# Altium integrated library DigitalLabBoard.IntLib: 47 symbols
Pins are listed as number, name and electrical type; pins without a type are passive.

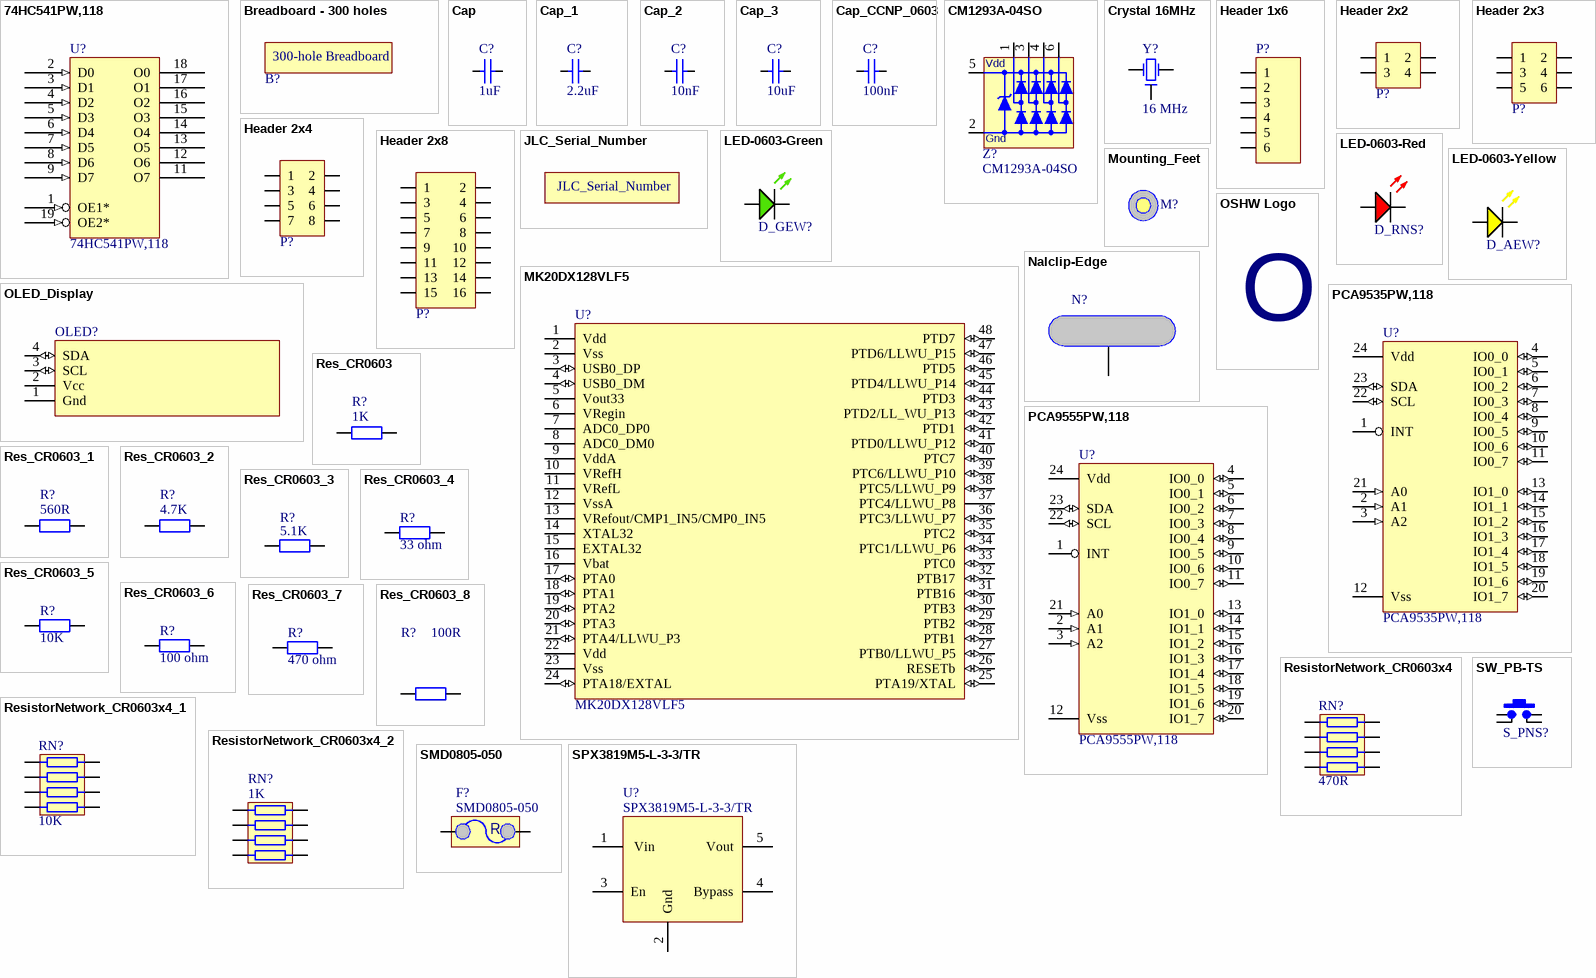
[diagram p0: symbols 74HC541PW,118 to SW_PB-TS]

## 74HC541PW,118
designator U?
Octal 3-State Buffer/Line Driver/LineReceiver; Digikey: 1727-5960-1-ND; Farnell PN: 2444902; LCSC: C5657
footprint TSSOP20_L (Shrink Small Outline; 20 Leads; Body Width 4.4 mm; Pitch 0.65 mm)
footprint TSSOP20_M (Shrink Small Outline; 20 Leads; Body Width 4.4 mm; Pitch 0.65 mm)
footprint TSSOP20_N (Shrink Small Outline; 20 Leads; Body Width 4.4 mm; Pitch 0.65 mm)
pins: 1 OE1* (in), 2 D0 (in), 3 D1 (in), 4 D2 (in), 5 D3 (in), 6 D4 (in), 7 D5 (in), 8 D6 (in), 9 D7 (in), 10 Gnd (power) hidden to Gnd, 11 O7 (hiz), 12 O6 (hiz), 13 O5 (hiz), 14 O4 (hiz), 15 O3 (hiz), 16 O2 (hiz), 17 O1 (hiz), 18 O0 (hiz), 19 OE2* (in), 20 Vdd (power) hidden to Vcc

## Breadboard - 300 holes
designator B?, comment Breadboard - 300 Hole  (value not drawn)
footprint Breadboard - 300 holes
text: 300-hole Breadboard

## Cap
designator C?, comment 1uF
Capacitor; Manufacturer: Generic Components; Class: Passive; Published: 08/06/2000; Publisher: Altium Hobart Technology Centre; SubClass: Capacitor; Farnell PN: *; Digikey: *; Value: 1uF; LCSC: C15849
simulation model CAP (Capacitor)
signal-integrity model Cap
footprint MLC0.1
footprint MLC0.2
footprint CCNP2012-0805
footprint CCNP1608-0603
footprint CCNP3216-1206
footprint CCNP3225-1210
footprint CAP - medium MKT (MKT Polyester block capacitor)
footprint CAP - small MKT (MKT Polyester block capacitor)
footprint CCNP1005-0402
pins: 1, 2

## Cap_1
designator C?, comment 2.2uF
Capacitor; Manufacturer: Generic Components; Class: Passive; Published: 08/06/2000; Publisher: Altium Hobart Technology Centre; SubClass: Capacitor; Farnell PN: *; Digikey: *; Value: 2.2uF; LCSC: C23630
simulation model CAP (Capacitor)
signal-integrity model Cap
footprint MLC0.1
footprint MLC0.2
footprint CCNP2012-0805
footprint CCNP1608-0603
footprint CCNP3216-1206
footprint CCNP3225-1210
footprint CAP - medium MKT (MKT Polyester block capacitor)
footprint CAP - small MKT (MKT Polyester block capacitor)
footprint CCNP1005-0402
pins: 1, 2

## Cap_2
designator C?, comment 10nF
Capacitor; Manufacturer: Generic Components; Class: Passive; Published: 08/06/2000; Publisher: Altium Hobart Technology Centre; SubClass: Capacitor; Farnell PN: *; Digikey: *; Value: 10nF; LCSC: C57112
simulation model CAP (Capacitor)
signal-integrity model Cap
footprint MLC0.1
footprint MLC0.2
footprint CCNP2012-0805
footprint CCNP1608-0603
footprint CCNP3216-1206
footprint CCNP3225-1210
footprint CAP - medium MKT (MKT Polyester block capacitor)
footprint CAP - small MKT (MKT Polyester block capacitor)
footprint CCNP1005-0402
pins: 1, 2

## Cap_3
designator C?, comment 10uF
Capacitor; Manufacturer: Generic Components; Class: Passive; Published: 08/06/2000; Publisher: Altium Hobart Technology Centre; SubClass: Capacitor; Farnell PN: *; Digikey: *; Value: 10uF; LCSC: C15850
simulation model CAP (Capacitor)
signal-integrity model Cap
footprint MLC0.1
footprint MLC0.2
footprint CCNP2012-0805
footprint CCNP1608-0603
footprint CCNP3216-1206
footprint CCNP3225-1210
footprint CAP - medium MKT (MKT Polyester block capacitor)
footprint CAP - small MKT (MKT Polyester block capacitor)
footprint CCNP1005-0402
pins: 1, 2

## Cap_CCNP_0603
designator C?, comment 100nF
Capacitor non-polar SMT 0603; Manufacturer: Generic Components; Class: Passive; Published: 08/06/2000; Publisher: Altium Hobart Technology Centre; SubClass: Capacitor; Farnell PN: *; Digikey: *; Value: 100nF; LCSC: C14663
simulation model CAP (Capacitor)
signal-integrity model Cap
footprint CCNP1608-0603
pins: 1, 2

## CM1293A-04SO
designator Z?
Ultra low capacitance quadruple rail-to-rail ESD protection; Farnell PN: 2533258; Digikey: CM1293A-04SOOSCT-ND; LCSC: C393377
footprint SOT457_L (SOT23, 6-Leads, Body 2.9x1.5mm, Pitch 0.95mm, Lead Span 2.8mm, IPC High Density)
footprint SOT457_M (SOT23, 6-Leads, Body 2.9x1.5mm, Pitch 0.95mm, Lead Span 2.8mm, IPC Low Density)
footprint SOT457_N (SOT23, 6-Leads, Body 2.9x1.5mm, Pitch 0.95mm, Lead Span 2.8mm, IPC Medium Density)
pins: 1, 2 Vn, 3, 4, 5 Vp, 6
1 alternate drawing of the same symbol
text: Vdd; Gnd

## Crystal 16MHz
designator Y?, comment 16 MHz
Crystal SMD 3.2 x 2.5 x 0.7 mm; Manufacturer: Generic Components; Class: Oscillator; SubClass: Crystal Oscillator; Published: 08/06/2000; Publisher: Altium Hobart Technology Centre; Digikey: *; Farnell PN: *; LCSC: C13738
footprint Crystal_SMD_3.2x2.5 (Crystal SMT low profile 3.2 x 2.5 SMD)
pins: 1 OSC1, 2 Gnd, 3 OSC2, 4 Gnd

## Header 1x6
designator P?, comment Header, 6-Pin  (value not drawn)
LatestRevisionDate: 17-Jul-2002; LatestRevisionNote: Re-released for DXP Platform.; Publisher: Altium Limited; LCSC: *; Farnell PN: *; Digikey: A26512-06-ND
footprint HDR1X6S (Connector; Header; 6 Position; Straight)
signal-integrity model Connector
pins: 1, 2, 3, 4, 5, 6

## Header 2x2
designator P?  (value not drawn)
LCSC: *; Digikey: A26528-02-ND
footprint HDR2X2S (Connector; Header; 2x2 Position; Straight)
pins: 1, 2, 3, 4
1 alternate drawing of the same symbol

## Header 2x3
designator P?  (value not drawn)
Digikey: A26528-03-ND
footprint HDR2X3S (Connector; Header; 2x3 Position; Straight)
pins: 1, 2, 3, 4, 5, 6
1 alternate drawing of the same symbol

## Header 2x4
designator P?  (value not drawn)
Digikey: A26528-04-ND
footprint HDR2X4S (Connector; Header; 2x4 Position; Straight)
pins: 1, 2, 3, 4, 5, 6, 7, 8
1 alternate drawing of the same symbol

## Header 2x8
designator P?  (value not drawn)
Digikey: A26528-08-ND
footprint HDR2X8S (Footprint not found)
pins: 1, 2, 3, 4, 5, 6, 7, 8, 9, 10, 11, 12, 13, 14, 15, 16
1 alternate drawing of the same symbol

## JLC_Serial_Number
designator JLC_Serial_Number?  (value not drawn)  (no BOM)
footprint JLC_Serial_Number

## LED-0603-Green
designator D_GEW?, comment LED Green  (value not drawn)
LED 0603 Green; Manufacturer: Generic Components; Class I: Optoelectronic; Published: 8-Jun-2000; Revision: July-2002: Re-released for DXP Platform.; Publisher: Altium Limited; Class II: LED; Farnell PN: 1581242; Digikey: *; LCSC: C72043
footprint LED1608-0603-GREEN (SMT-LED 0603)
footprint LED1608-0603-GREEN_N (SMT-LED 0603)
pins: A, K

## LED-0603-Red
designator D_RNS?, comment LED Red  (value not drawn)
LED 0603 Red; Manufacturer: Generic Components; Class I: Optoelectronic; Published: 8-Jun-2000; Revision: July-2002: Re-released for DXP Platform.; Publisher: Altium Limited; Class II: LED; Farnell PN: 1581239; Digikey: *; LCSC: C2286
footprint LED1608-0603-RED (SMT-LED 0603)
footprint LED1608-0603-RED_N (SMT-LED 0603)
pins: A, K

## LED-0603-Yellow
designator D_AEW?, comment LED Yellow  (value not drawn)
LED 0603 Yellow; Manufacturer: Generic Components; Class I: Optoelectronic; Published: 8-Jun-2000; Revision: July-2002: Re-released for DXP Platform.; Publisher: Altium Limited; Class II: LED; Farnell PN: 5790852; Digikey: *; LCSC: C72038
footprint LED1608-0603-Yellow (SMT-LED 0603)
footprint LED1608-0603-Yellow_N (SMT-LED 0603)
pins: A, K

## MK20DX128VLF5
designator U?
Kinetis K20: 50MHz Cortex-M4 Performance MCU, 160KB Flash, 16KB SRAM, Full-Speed USB, 48-LQFP; Farnell PN: 2133571; Digikey: MK20DX128VLF50-ND; Mouser: 841-MK20DX128VLF5
footprint TSQFP50P900X900-48L (Thin QFP, 48-Leads, Body 7x7mm, Pitch 0.5mm, IPC High Density)
footprint TSQFP50P900X900-48M (Thin QFP, 48-Leads, Body 7x7mm, Pitch 0.5mm, IPC Low Density)
footprint TSQFP50P900X900-48N (Thin QFP, 48-Leads, Body 7x7mm, Pitch 0.5mm, IPC Medium Density)
pins: 1 Vdd (power), 2 Vss (power), 3 USB0_DP (io), 4 USB0_DM (io), 5 Vout33 (power), 6 VRegin, 7 ADC0_DP0, 8 ADC0_DM0, 9 VddA (power), 10 VRefH, 11 VRefL, 12 VssA (power), 13 VRefout/CMP1_IN5/CMP0_IN5, 14 XTAL32, 15 EXTAL32, 16 Vbat, 17 PTA0 (io), 18 PTA1 (io), 19 PTA2 (io), 20 PTA3 (io), 21 PTA4/LLWU_P3 (io), 22 Vdd (power), 23 Vss (power), 24 PTA18/EXTAL (io), 25 PTA19/XTAL (io), 26 RESETb (io), 27 PTB0/LLWU_P5 (io), 28 PTB1 (io), 29 PTB2 (io), 30 PTB3 (io), 31 PTB16 (io), 32 PTB17 (io), 33 PTC0 (io), 34 PTC1/LLWU_P6 (io), 35 PTC2 (io), 36 PTC3/LLWU_P7 (io), 37 PTC4/LLWU_P8 (power), 38 PTC5/LLWU_P9 (io), 39 PTC6/LLWU_P10 (io), 40 PTC7 (io), 41 PTD0/LLWU_P12 (io), 42 PTD1 (io), 43 PTD2/LL_WU_P13 (io), 44 PTD3 (io), 45 PTD4/LLWU_P14 (io), 46 PTD5 (io), 47 PTD6/LLWU_P15 (io), 48 PTD7 (io)

## Mounting_Feet
designator M?, comment Plastic Bumper  (value not drawn)
Plastic bumper/foot; Digikey: RPC4821-ND; Farnell PN: *; LCSC: *
footprint Bumper_RBS-2 (Plastic bumper/foot)
footprint Bumper_RBS-10 (Plastic bumper/foot)
footprint Bumper_RBS-2 + 3mm hole (Plastic bumper/foot + 3mm hole)
footprint Bumper_RBS-10 + 3mm hole (Plastic bumper/foot + 3mm hole)

## Nalclip-Edge
designator N?, comment Gnd  (value not drawn)  (no BOM)
footprint Nalclip-Edge (Nalclip on edge of PCB)
pins: 1

## OLED_Display
designator OLED?  (value not drawn)
OLED Display 128x32 pixels, I2C interface
footprint OLED_Display_128x32 (Small OLED Display)
pins: 1 Gnd (power), 2 Vcc (power), 3 SCL (io), 4 SDA (io)

## OSHW Logo
designator Logo?  (value not drawn)  (no BOM)
footprint OSHW (OSHW Logo)
text: O

## PCA9535PW,118
designator U?
16-bit I2C I/O Expander (TSSOP24) / NO PUPs on I/O pins; Farnell PN: 2776149; Digikey: 568-10296-1-ND; LCSC: C255606
footprint TSSOP24_L (Shrink Small Outline; 24 Leads; Body Width 4.4 mm; Pitch 0.65 mm)
footprint TSSOP24_M (Shrink Small Outline; 24 Leads; Body Width 4.4 mm; Pitch 0.65 mm)
footprint TSSOP24_N (Shrink Small Outline; 24 Leads; Body Width 4.4 mm; Pitch 0.65 mm)
pins: 1 INT (oc), 2 A1 (in), 3 A2 (in), 4 IO0_0 (io), 5 IO0_1 (io), 6 IO0_2 (io), 7 IO0_3 (io), 8 IO0_4 (io), 9 IO0_5 (io), 10 IO0_6 (io), 11 IO0_7 (io), 12 Vss (power), 13 IO1_0 (io), 14 IO1_1 (io), 15 IO1_2 (io), 16 IO1_3 (io), 17 IO1_4 (io), 18 IO1_5 (io), 19 IO1_6 (io), 20 IO1_7 (io), 21 A0 (in), 22 SCL (io), 23 SDA (io), 24 Vdd (power)

## PCA9555PW,118
designator U?
16-bit I2C I/O Expander (TSSOP24) / PUPs on I/O pins; Farnell PN: 2101299; Digikey: 568-1058-1-ND; LCSC: C128392
footprint TSSOP24_L (Shrink Small Outline; 24 Leads; Body Width 4.4 mm; Pitch 0.65 mm)
footprint TSSOP24_M (Shrink Small Outline; 24 Leads; Body Width 4.4 mm; Pitch 0.65 mm)
footprint TSSOP24_N (Shrink Small Outline; 24 Leads; Body Width 4.4 mm; Pitch 0.65 mm)
pins: 1 INT (oc), 2 A1 (in), 3 A2 (in), 4 IO0_0 (io), 5 IO0_1 (io), 6 IO0_2 (io), 7 IO0_3 (io), 8 IO0_4 (io), 9 IO0_5 (io), 10 IO0_6 (io), 11 IO0_7 (io), 12 Vss (power), 13 IO1_0 (io), 14 IO1_1 (io), 15 IO1_2 (io), 16 IO1_3 (io), 17 IO1_4 (io), 18 IO1_5 (io), 19 IO1_6 (io), 20 IO1_7 (io), 21 A0 (in), 22 SCL (io), 23 SDA (io), 24 Vdd (power)

## Res_CR0603
designator R?, comment 1K
Resistor SMT 0603; Manufacturer: Generic Components; Class: Passive; Published: 08/06/2000; Publisher: Altium Hobart Technology Centre; SubClass: Resistor; Farnell PN: *; Digikey: *; Value: 1K; LCSC: C21190
simulation model RESISTOR (Resistor)
signal-integrity model Res
footprint CR1608-0603
pins: 1, 2

## Res_CR0603_1
designator R?, comment 560R
Resistor SMT 0603; Manufacturer: Generic Components; Class: Passive; Published: 08/06/2000; Publisher: Altium Hobart Technology Centre; SubClass: Resistor; Farnell PN: *; Digikey: *; Value: 560R; LCSC: C23204
simulation model RESISTOR (Resistor)
signal-integrity model Res
footprint CR1608-0603
pins: 1, 2

## Res_CR0603_2
designator R?, comment 4.7K
Resistor SMT 0603; Manufacturer: Generic Components; Class: Passive; Published: 08/06/2000; Publisher: Altium Hobart Technology Centre; SubClass: Resistor; Farnell PN: *; Digikey: *; Value: 4.7K; LCSC: C23162
simulation model RESISTOR (Resistor)
signal-integrity model Res
footprint CR1608-0603
pins: 1, 2

## Res_CR0603_3
designator R?, comment 5.1K
Resistor SMT 0603; Manufacturer: Generic Components; Class: Passive; Published: 08/06/2000; Publisher: Altium Hobart Technology Centre; SubClass: Resistor; Farnell PN: *; Digikey: *; Value: 5.1K; LCSC: C23186
simulation model RESISTOR (Resistor)
signal-integrity model Res
footprint CR1608-0603
pins: 1, 2

## Res_CR0603_4
designator R?, comment value 33 ohm  (hidden comment: 33R)
Resistor SMT 0603; Manufacturer: Generic Components; Class: Passive; Published: 08/06/2000; Publisher: Altium Hobart Technology Centre; SubClass: Resistor; Farnell PN: *; Digikey: *; LCSC: C23140
simulation model RESISTOR (Resistor)
signal-integrity model Res
footprint CR1608-0603
pins: 1, 2

## Res_CR0603_5
designator R?, comment 10K
Resistor SMT 0603; Manufacturer: Generic Components; Class: Passive; Published: 08/06/2000; Publisher: Altium Hobart Technology Centre; SubClass: Resistor; Farnell PN: *; Digikey: *; Value: 10K; LCSC: C25804
simulation model RESISTOR (Resistor)
signal-integrity model Res
footprint CR1608-0603
pins: 1, 2

## Res_CR0603_6
designator R?, comment value 100 ohm  (hidden comment: 100R)
Resistor SMT 0603; Manufacturer: Generic Components; Class: Passive; Published: 08/06/2000; Publisher: Altium Hobart Technology Centre; SubClass: Resistor; Farnell PN: *; Digikey: *; LCSC: C22775
simulation model RESISTOR (Resistor)
signal-integrity model Res
footprint CR1608-0603
pins: 1, 2

## Res_CR0603_7
designator R?, comment value 470 ohm  (hidden comment: 470R)
Resistor SMT 0603; Manufacturer: Generic Components; Class: Passive; Published: 08/06/2000; Publisher: Altium Hobart Technology Centre; SubClass: Resistor; Farnell PN: *; Digikey: *; LCSC: C23179
simulation model RESISTOR (Resistor)
signal-integrity model Res
footprint CR1608-0603
pins: 1, 2

## Res_CR0603_8
designator R?, comment 100R
Resistor SMT 0603; Manufacturer: Generic Components; Class: Passive; Published: 08/06/2000; Publisher: Altium Hobart Technology Centre; SubClass: Resistor; Farnell PN: *; Digikey: *; LCSC: C22775; Value: 100R
simulation model RESISTOR (Resistor)
signal-integrity model Res
footprint CR1608-0603
footprint CR1608-0603_N
pins: 1, 2

## ResistorNetwork_CR0603x4
designator RN?, comment 470R
SMT x4 Resistor Array; Value: 470 ohm; Farnell PN: *; Digikey: *; LCSC: C25510
footprint CR1206-0603_X4 (SMT 0603 x 4 Ceramic resistor array (1206))
footprint CR1206-0603_X4_L (Chip Array, ConvexS, 8-Leads, Pitch 0.80mm, Body 3.40x1.75mm, IPC High Density)
footprint CR1206-0603_X4_M (Chip Array, ConvexS, 8-Leads, Pitch 0.80mm, Body 3.40x1.75mm, IPC Low Density)
footprint CR1206-0603_X4_N (Chip Array, ConvexS, 8-Leads, Pitch 0.80mm, Body 3.40x1.75mm, IPC Medium Density)
pins: 1, 2, 3, 4, 5, 6, 7, 8

## ResistorNetwork_CR0603x4_1
designator RN?, comment 10K
SMT x4 Resistor Array; Farnell PN: *; Digikey: *; Value: 10K; LCSC: C29718
footprint CR1206-0603_X4 (SMT 0603 x 4 Ceramic resistor array (1206))
footprint CR1206-0603_X4_L (Chip Array, ConvexS, 8-Leads, Pitch 0.80mm, Body 3.40x1.75mm, IPC High Density)
footprint CR1206-0603_X4_M (Chip Array, ConvexS, 8-Leads, Pitch 0.80mm, Body 3.40x1.75mm, IPC Low Density)
footprint CR1206-0603_X4_N (Chip Array, ConvexS, 8-Leads, Pitch 0.80mm, Body 3.40x1.75mm, IPC Medium Density)
pins: 1, 2, 3, 4, 5, 6, 7, 8

## ResistorNetwork_CR0603x4_2
designator RN?, comment 1K
SMT x4 Resistor Array; Farnell PN: *; Digikey: *; Value: 1K; LCSC: C20197
footprint CR1206-0603_X4 (SMT 0603 x 4 Ceramic resistor array (1206))
footprint CR1206-0603_X4_L (Chip Array, ConvexS, 8-Leads, Pitch 0.80mm, Body 3.40x1.75mm, IPC High Density)
footprint CR1206-0603_X4_M (Chip Array, ConvexS, 8-Leads, Pitch 0.80mm, Body 3.40x1.75mm, IPC Low Density)
footprint CR1206-0603_X4_N (Chip Array, ConvexS, 8-Leads, Pitch 0.80mm, Body 3.40x1.75mm, IPC Medium Density)
pins: 1, 2, 3, 4, 5, 6, 7, 8

## SMD0805-050
designator F?
PTC Resetable Fuse 0805 0.5A hold; LCSC: C66452
footprint SMD0805-050
pins: 1, 2
text: R

## SPX3819M5-L-3-3/TR
designator U?
3.3V LDO with enable; LCSC: C9055; Farnell PN: 2889625; Digikey: 1016-1873-1-ND
footprint SOT-23-5 (SOT-23; 5 Leads; Body 3.0 x 2.3 mm, inc. leads (LxW max))
footprint SOT-23-5_L (SOT23, 5-Leads, Body 2.9x1.7mm, Pitch 0.95mm, Lead Span 2.8mm, IPC High Density)
pins: 1  Vin, 2 Gnd, 3 En, 4 Bypass, 5 Vout

## SW_PB-TS
designator S_PNS?
Tactile Switch SPST 5.10mm X 5.10mm / (1.5mm=C318884) / (2.0mm=C318888) / (3.5mm=C318886); Revision: 1.0; LCSC: C318888
footprint SMD-SW-4_5.1x5.1x1.5_N (Miniature SMD PCB Push Button - C318884)
footprint SMD-SW-4_5.1x5.1x2.0_N (Miniature SMD PCB Push Button - C318888)
footprint SMD-SW-4_5.1x5.1x3.5_N (Miniature SMD PCB Push Button - C318886)
footprint SMD-SW-4_5.1x5.1x3.5_M (Miniature SMD PCB Push Button - C318886)
footprint SMD-SW-4_5.1x5.1x2.0_M (Miniature SMD PCB Push Button - C318888)
footprint SMD-SW-4_5.1x5.1x1.5_M (Miniature SMD PCB Push Button - C318884)
pins: 1, 1b, 2, 2b

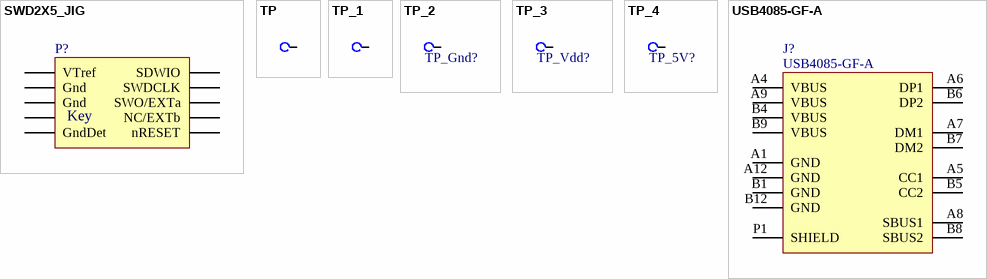
[diagram p1: symbols SWD2X5_JIG to USB4085-GF-A]

## SWD2X5_JIG
designator P?, comment SWD Connector 2x5-Pin  (value not drawn)  (no BOM)
LatestRevisionDate: 17-Jul-2002; LatestRevisionNote: Re-released for DXP Platform.; Publisher: Altium Limited; Farnell PN: 1865285; LCSC: *
signal-integrity model Connector
footprint SWD-2x5-Jig-Pin-holder (Connector; SWD; 2x5 Position)
footprint SWD-2x5-Jig-Pin-guide (Connector; SWD; 2x5 Position)
footprint SWD-2x5-Jig-Pads (Connector; SWD; 2x5 Position)
footprint SWD-2x5-Jig-Header (Connector; SWD; 2x5 Position)
pins: 0 Pins (power) "Key", 1 VTref, 2 SDWIO, 3 Gnd, 4 SWDCLK, 5 Gnd, 6 SWO/EXTa, 8 NC/EXTb, 9 GndDet, 10 nRESET
text: Key

## TP
designator TP_SCL?, comment SCL  (value not drawn)  (no BOM)
Test Point; Digikey: *; Farnell PN: *
footprint PCBPIN - 0.7mm
footprint PCBPIN - 0.9mm
footprint PCBPIN - 1mm
pins: 1 TP

## TP_1
designator TP_SDA?, comment SDA  (value not drawn)  (no BOM)
Test Point; Digikey: *; Farnell PN: *
footprint PCBPIN - 0.7mm
footprint PCBPIN - 0.9mm
footprint PCBPIN - 1mm
pins: 1 TP

## TP_2
designator TP_Gnd?, comment Gnd  (value not drawn)  (no BOM)
Test Point; Digikey: *; Farnell PN: *
footprint PCBPIN - 0.7mm
footprint PCBPIN - 0.9mm
footprint PCBPIN - 1mm
pins: 1 TP

## TP_3
designator TP_Vdd?, comment Vdd  (value not drawn)  (no BOM)
Test Point; Digikey: *; Farnell PN: *
footprint PCBPIN - 0.7mm
footprint PCBPIN - 0.9mm
footprint PCBPIN - 1mm
pins: 1 TP

## TP_4
designator TP_5V?, comment 5V  (value not drawn)  (no BOM)
Test Point; Digikey: *; Farnell PN: *
footprint PCBPIN - 0.7mm
footprint PCBPIN - 0.9mm
footprint PCBPIN - 1mm
pins: 1 TP

## USB4085-GF-A
designator J?
USB-C, USB 2.0 Receptacle Connector 16 Position Through Hole, Right Angle; Angle: 90; Part Number: USB4085-GF-A; Digikey Part Number: 2073-USB4085-GF-ACT-ND; Digikey Link: https://www.digikey.ee/product-detail/en/gct/USB4085-GF-A/2073-USB4085-GF-ACT-ND/9859733; Digikey: 2073-USB4085-GF-ACT-ND; Farnell PN: 2924867; LCSC: *
footprint USB4085-GF-A (USB-C Connector)
pins: A1 GND, A4 VBUS, A5 CC1, A6 DP1, A7 DM1, A8 SBUS1, A9 VBUS, A12 GND, B1 GND, B4 VBUS, B5 CC2, B6 DP2, B7 DM2, B8 SBUS2, B9 VBUS, B12 GND, P1 SHIELD